# Altium footprint library Sajad_Altium_Library.PcbLib: 333 footprints (part 5 of 21)
Each footprint in its own frame and in the unit in brackets; x right, y up, seen from the top. Pads: shape width x height; smd on the part's side, far side on the other; paste and mask are expansions set on the pad; w line width, h text height; cw(c..) or ccw(c..) is an arc to the next point about the centre after c.
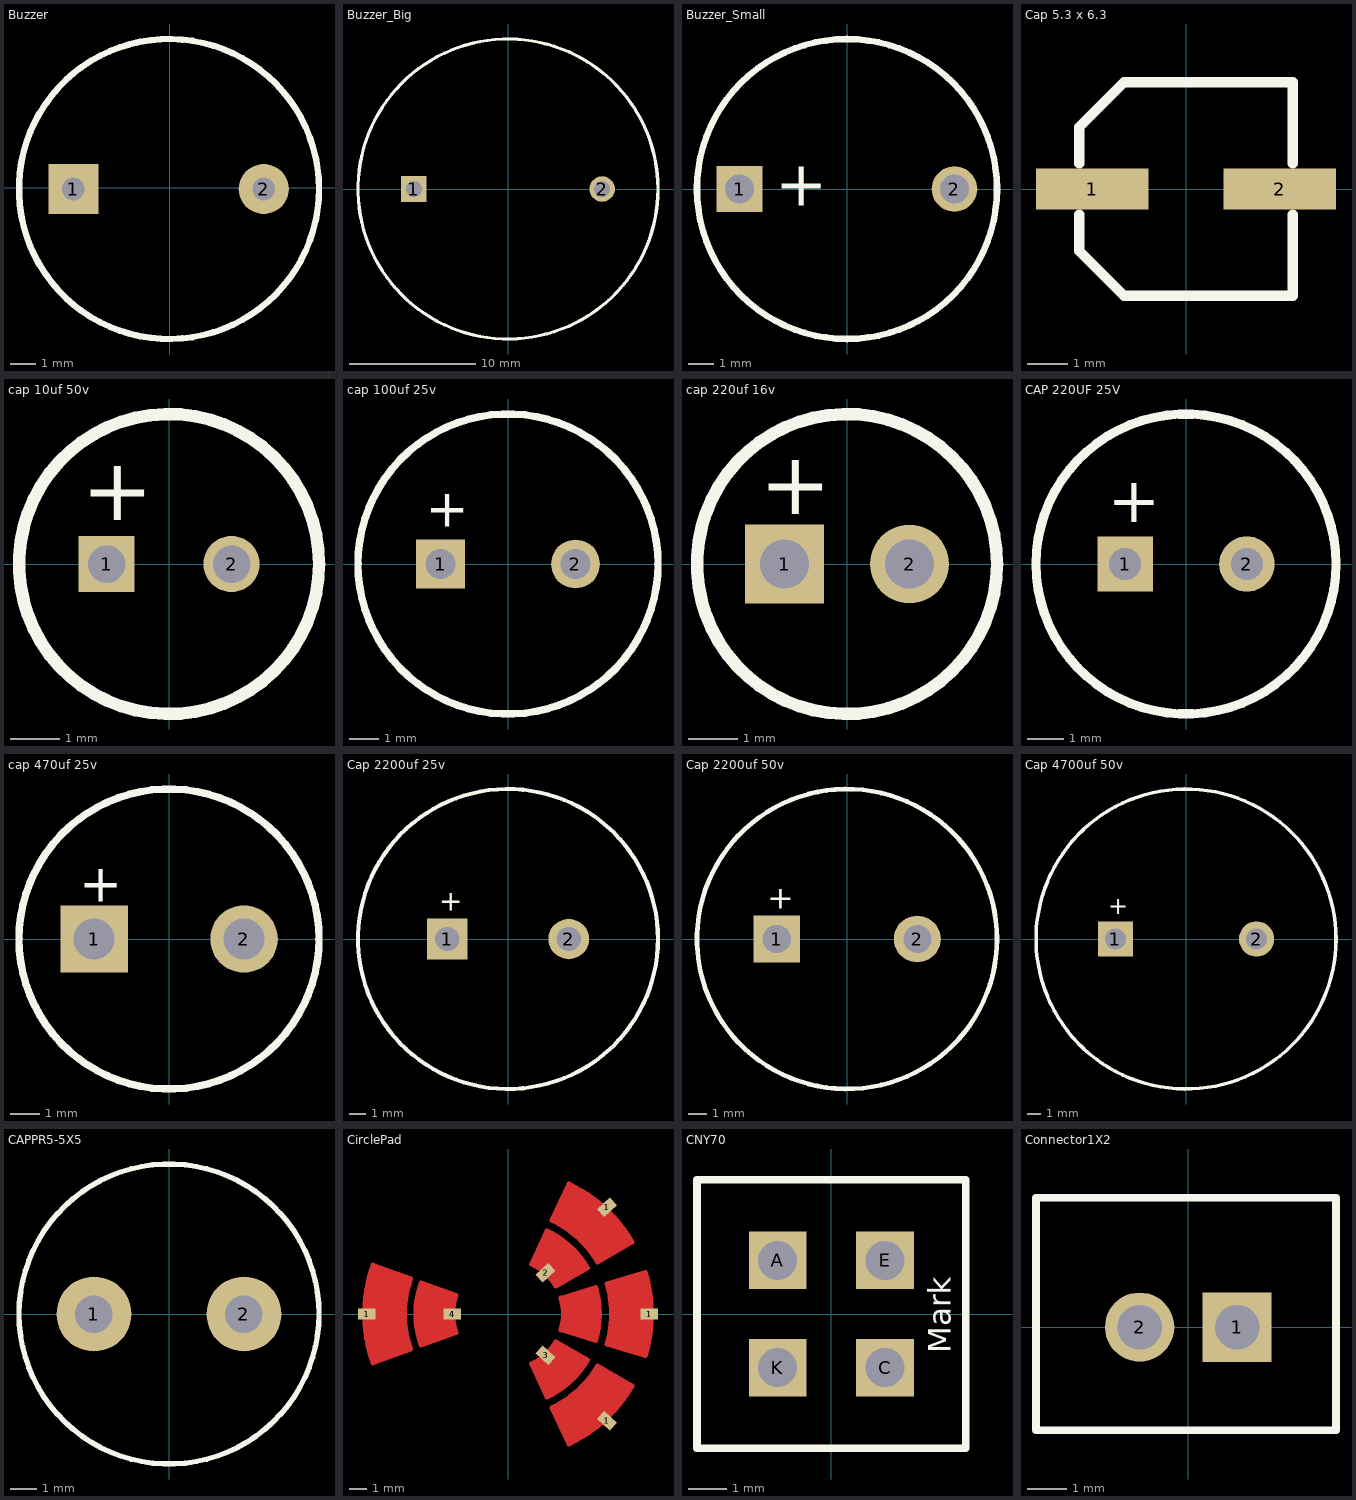
[diagram p4: the footprints below, top view; thin cyan lines are the x and y axes]

## Buzzer [mm]
pads (2):
  rect 2x2 hole 0.9: 1(-3.861,-0.051)
  round 2 hole 0.9: 2(3.759,-0.051)
Top Overlay:
  circle w0.254: c-0.031,-0.051 r6
3D body: height 6.98, standoff -6.1, extent -5.918,-5.918 5.918,5.918

## Buzzer_Big [mil] "Buzzer 6v to 24v"
pads (2):
  rect 80x80 hole 50: 1(-295,0)
  round 80 hole 50: 2(295,0)
Top Overlay:
  circle w10: c0,0 r470
3D body: height 736.22, standoff 0, extent -464.56,-464.56 464.57,464.57

## Buzzer_Small [mil] "Buzzer 6v to 24v"
pads (2):
  rect 70x70 hole 45: 1(-165,0)
  round 70 hole 45: 2(165,0)
Top Overlay:
  circle w10: c0,0 r230.31
  text "+" at -110,-26 h70
3D body: height 275, standoff -240, extent -233,-233 233,233

## Cap 5.3 x 6.3 [mm] "5.3 x 6.3 mm Smd Capacitor"
pads (2):
  rect 2.8x1.016 smd: 1(-2.327,0) 2(2.327,0)
Top Overlay:
  lines w0.254: -2.65,-0.635 -2.65,-1.541 -1.541,-2.65 2.65,-2.65 2.65,-0.635 ; -2.65,0.635 -2.65,1.541 -1.541,2.65 2.65,2.65 2.65,0.635
3D body: height 5.41, standoff 0, extent -2.95,-2.65 2.95,2.65

## cap 10uf 50v [mil] "cap 10uf 50v"
pads (2):
  rect 45x45 hole 30: 1(-50,0)
  round 45 hole 30: 2(50,0)
Top Overlay:
  circle w10: c0,0 r120
  text "+" at -70,35 h50

## cap 100uf 25v [mil] "cap 100uf 25v"
pads (2):
  rect 65x65 hole 40: 1(-90,0)
  round 65 hole 40: 2(90,0)
Top Overlay:
  circle w10: c0,0 r200
  text "+" at -110,50 h50
3D body: height 624.96, standoff -752.99, extent -196.85,-196.85 196.85,196.85

## cap 220uf 16v [mm] "cap 220uf 16v"
pads (2):
  rect 1.6x1.6 hole 1: 1(-1.27,0)
  round 1.6 hole 1: 2(1.27,0)
Top Overlay:
  circle w0.254: c0,0 r3.048
  text "+" at -1.778,1.016 h1.27
3D body: height 11.09, standoff -18.91, extent -3.15,-3.15 3.15,3.15

## CAP 220UF 25V [mil] "cap 220uf 25v"
pads (2):
  rect 60x60 hole 35: 1(-66,0)
  round 60 hole 35: 2(66,0)
Top Overlay:
  circle w10: c0,0 r162.5
  text "+" at -85,45 h50
3D body: height 445.89, standoff -754.41, extent -157.48,-157.48 157.48,157.48

## cap 470uf 25v [mil] "cap 470uf 25v"
pads (2):
  rect 90x90 hole 55: 1(-100,0)
  round 90 hole 55: 2(100,0)
Top Overlay:
  circle w10: c0,0 r200
  text "+" at -120,50 h50
3D body: height 634.96, standoff -742.99, extent -196.85,-196.85 196.85,196.85

## Cap 2200uf 25v [mil] "Cap 2200uf 25v"
pads (2):
  rect 100x100 hole 60: 1(-150,0)
  round 100 hole 60: 2(150,0)
Top Overlay:
  circle w10: c0,0 r370
  text "+" at -170,70 h50
3D body: height 629.92, standoff 0, extent -370.27,-370.27 370.27,370.27

## Cap 2200uf 50v [mil] "Cap 2200uf 50v"
pads (2):
  rect 100x100 hole 60: 1(-150,0)
  round 100 hole 60: 2(150,0)
Top Overlay:
  circle w10: c0,0 r320
  text "+" at -170,65 h50
3D body: height 992.13, standoff -740.16, extent -314.97,-314.96 314.95,314.97

## Cap 4700uf 50v [mil] "Cap 4700uf 50v"
pads (2):
  rect 100x100 hole 60: 1(-200,0)
  round 100 hole 60: 2(200,0)
Top Overlay:
  circle w10: c0,0 r425
  text "+" at -220,70 h50

## CAPPR5-5X5 [mil] "Capacitor, Electrolytic, Radial; Body 5 x 5 mm (Dia.xH typ); Pin Spacing 5 mm (typ)"
pads (2):
  round 110 hole 55: 1(-110,0) 2(110,0)
Top Overlay:
  lines w7.87: -220,0 ccw(c0,0) 220,0 ccw(c0,0) -220,0
3D body: height 477.56, standoff -152.36, extent -196.85,-195 196.85,198.7

## CirclePad [mil]
pads (14):
  rect 40x25 smd: 1(-323,0) 1(323,0) 4(-128,0)
  rect 40x25 on Top Solder: 1(-323,0) 1(323,0) 4(-128,0)
  rect 25x40 smd rot 47.5: 1(226,-244) 3(86,-94)
  rect 25x40 on Top Solder rot 47.5: 1(226,-244) 3(86,-94)
  rect 25x40 smd rot 132.5: 1(226,244) 2(86,94)
  rect 25x40 on Top Solder rot 132.5: 1(226,244) 2(86,94)
Top Layer:
  region: 123,35 128,0 120.48,-36.83 200.43,-61.57 208,-1 200.43,61.57
  region: 89.02,190.9 147,150 181.87,105 109.11,62.99 74,102 53.24,114.18
  region: 138.93,297.94 201,259 263,195 284.7,164.37 204.57,118.11 169,170 99.83,214.09
  region: 225.9,69.06 237,8 225.9,-69.06 314.38,-96.11 328,-21 320,73 314.38,96.11 306,93.55
  region: 99.83,-214.09 138.93,-297.94 196,-262 256,-203 284,-163.97 204.57,-118.11 161,-177
  region: 53.24,-114.18 89.02,-190.9 147,-152 182.41,-105.31 109.11,-62.99 86,-93
  region: -221.97,80.79 -238,17 -232,-49 -221.97,-80.79 -308.91,-112.44 -326,-28 -321,66 -308.91,112.44
  region: -198.92,72.05 -208,35 -210,-6 -202,-55 -198.93,-72.04 -118.39,-43.09 -130,-6 -118.39,43.09
  lines w10: -198.93,-72.04 cw(c-1,0) -198.93,72.04 ; -198.92,-72.05 -118.39,-43.09 cw(c0,0) -118.39,43.09 -198.92,72.05 ; 200.43,-61.58 ccw(c-1,0) 200.43,61.58 ; 200.43,-61.57 120.48,-36.83 ccw(c0,0) 120.48,36.83 200.43,61.57 ; -308.91,-112.44 cw(c0,0) -308.91,112.44 -221.97,80.79 ccw(c0,0) -221.97,-80.79 -308.91,-112.44 ; 53.24,-114.18 ccw(c0,0) 109.11,-62.99 182.41,-105.31 cw(c0,0) 89.02,-190.9 53.24,-114.18 ; 53.24,114.18 cw(c0,0) 109.11,62.99 182.41,105.31 ccw(c0,0) 89.02,190.9 53.24,114.18 ; 99.83,-214.09 ccw(c0,0) 204.57,-118.11 284.7,-164.37 cw(c0,0) 138.93,-297.94 99.83,-214.09 ; 99.83,214.09 cw(c0,0) 204.57,118.11 284.7,164.37 ccw(c0,0) 138.93,297.94 99.83,214.09 ; 225.9,-69.06 ccw(c0,0) 225.9,69.06 314.38,96.11 cw(c0,0) 314.38,-96.11 225.9,-69.06
Top Solder:
  region: -198.92,72.05 -208,35 -210,-6 -202,-55 -198.93,-72.04 -118.39,-43.09 -130,-6 -118.39,43.09
  region: -221.97,80.79 -238,17 -232,-49 -221.97,-80.79 -308.91,-112.44 -326,-28 -321,66 -308.91,112.44
  region: 53.24,-114.18 89.02,-190.9 147,-152 182.41,-105.31 109.11,-62.99 86,-93
  region: 99.83,-214.09 138.93,-297.94 196,-262 256,-203 284,-163.97 204.57,-118.11 161,-177
  region: 225.9,69.06 237,8 225.9,-69.06 314.38,-96.11 328,-21 320,73 314.38,96.11 306,93.55
  region: 138.93,297.94 201,259 263,195 284.7,164.37 204.57,118.11 169,170 99.83,214.09
  region: 89.02,190.9 147,150 181.87,105 109.11,62.99 74,102 53.24,114.18
  region: 123,35 128,0 120.48,-36.83 200.43,-61.57 208,-1 200.43,61.57
  lines w10: -198.93,-72.04 cw(c-1,0) -198.93,72.04 ; -198.92,-72.05 -118.39,-43.09 cw(c0,0) -118.39,43.09 -198.92,72.05 ; 200.43,-61.58 ccw(c-1,0) 200.43,61.58 ; 200.43,-61.57 120.48,-36.83 ccw(c0,0) 120.48,36.83 200.43,61.57 ; -308.91,-112.44 cw(c0,0) -308.91,112.44 -221.97,80.79 ccw(c0,0) -221.97,-80.79 -308.91,-112.44 ; 53.24,-114.18 ccw(c0,0) 109.11,-62.99 182.41,-105.31 cw(c0,0) 89.02,-190.9 53.24,-114.18 ; 53.24,114.18 cw(c0,0) 109.11,62.99 182.41,105.31 ccw(c0,0) 89.02,190.9 53.24,114.18 ; 99.83,-214.09 ccw(c0,0) 204.57,-118.11 284.7,-164.37 cw(c0,0) 138.93,-297.94 99.83,-214.09 ; 99.83,214.09 cw(c0,0) 204.57,118.11 284.7,164.37 ccw(c0,0) 138.93,297.94 99.83,214.09 ; 225.9,-69.06 ccw(c0,0) 225.9,69.06 314.38,96.11 cw(c0,0) 314.38,-96.11 225.9,-69.06

## CNY70 [mm]
height 5.6
pads (4):
  rect 1.5x1.5 hole 1.016: A(-1.4,1.4) C(1.4,-1.4) E(1.4,1.4) K(-1.4,-1.4)
Top Overlay:
  lines w0.2: -3.5,-3.5 -3.5,3.5 3.5,3.5 3.5,-3.5 -3.5,-3.5
  text "Mark" at 3.302,-1.024 h1.02

## Connector1X2 [mil] "Connector;  2.5 mm"
pads (2):
  rect 70x70 hole 45: 1(49.21,0)
  round 70 hole 45: 2(-49.21,0)
Top Overlay:
  lines w7.87: -153.94,-104.2 -153.94,130.8 149.21,130.8 149.21,-104.2 -153.94,-104.2
3D body: height 338.01, standoff -94.27, extent -100,-50 100,50